# Altium footprint library myLibs.PcbLib: 48 footprints (part 1 of 3)
Each footprint in its own frame and in the unit in brackets; x right, y up, seen from the top. Pads: shape width x height; smd on the part's side, far side on the other; paste and mask are expansions set on the pad; w line width, h text height; cw(c..) or ccw(c..) is an arc to the next point about the centre after c.
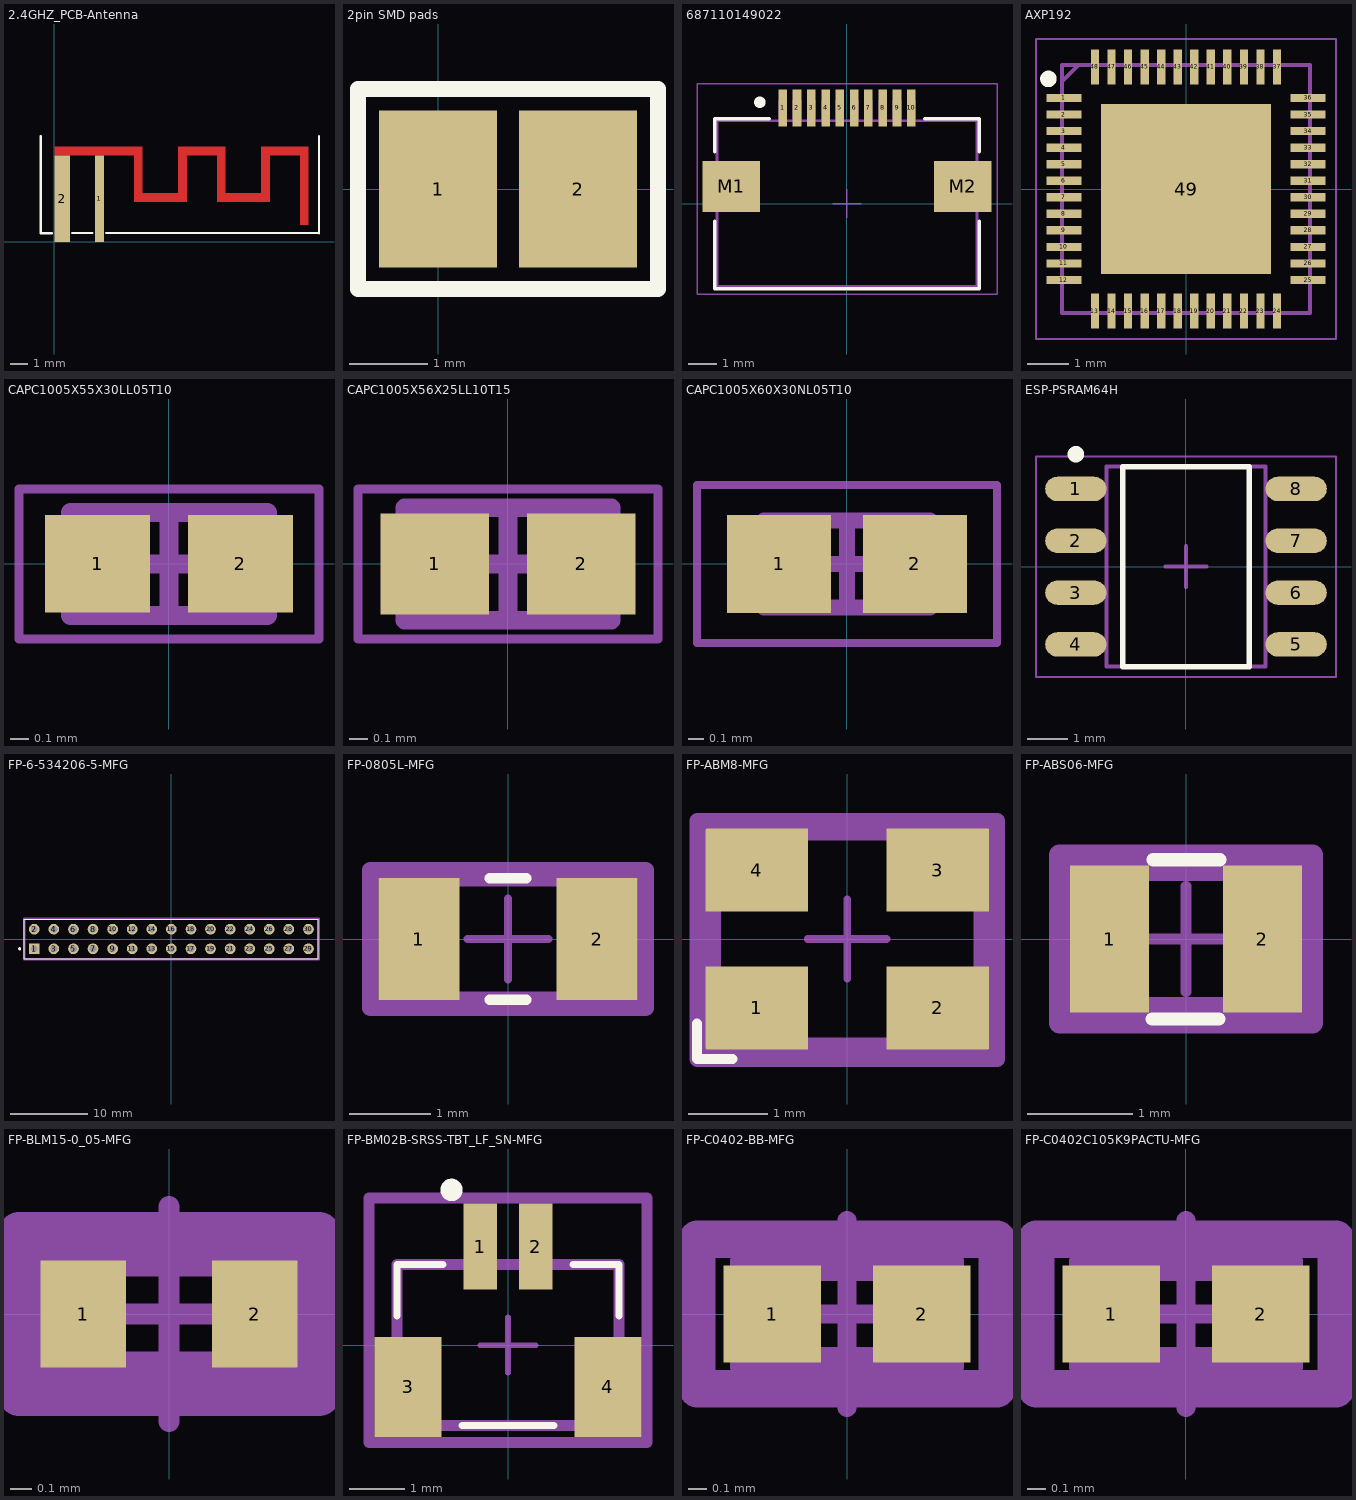
[diagram p0: the footprints below, top view; thin cyan lines are the x and y axes]

## 2.4GHZ_PCB-Antenna [mm] "2.4GHZ_PCB-Antenna"
pads (2):
  rect 0.5x4.9 smd mask+0.102: 1(2.55,2.45)
  rect 0.9x4.9 smd mask+0.102: 2(0.45,2.45)
Top Layer:
  rectangle: 5,2.26 7,2.76
  rectangle: 4.5,2.26 5,4.9
  rectangle: 7,2.26 7.5,4.9
  rectangle: 9.2,2.26 9.7,4.9
  rectangle: 9.7,2.26 11.7,2.76
  rectangle: 11.7,2.26 12.2,4.9
  rectangle: 13.9,0.96 14.4,4.9
  rectangle: 11.7,4.9 14.4,5.4
  rectangle: 7,4.9 9.7,5.4
  rectangle: 0,4.9 5,5.4
Top Overlay:
  lines w0.127: -0.762,6 -0.762,0.5 -0.135,0.5 ; 1.016,0.508 2.159,0.508 ; 2.921,0.508 14.978,0.508 ; 14.986,0.5 14.986,6
Multi-Layer:
  pour cut-out: -0.5,6 -0.5,0.5 14.7,0.5 14.7,6 -0.5,6 -0.5,0.5 14.7,0.5 14.7,6
  pour cut-out: -0.762,6 -0.762,0.5 14.986,0.5 14.986,6

## 2pin SMD pads [mm] "generic pads"
pads (2):
  rect 1.5x2 smd mask+0.102: 1(0,0) 2(1.778,0)
Top Overlay:
  lines w0.2: -1.016,-1.27 2.794,-1.27 2.794,1.27 -1.016,1.27 -1.016,-1.27

## 687110149022 [mm]
pads (12):
  rect 0.3x1.3 smd: 1(-2.25,3.35) 2(-1.75,3.35) 3(-1.25,3.35) 4(-0.75,3.35) 5(-0.25,3.35) 6(0.25,3.35) 7(0.75,3.35) 8(1.25,3.35) 9(1.75,3.35) 10(2.25,3.35)
  rect 2x1.8 smd: M1(-4.05,0.6) M2(4.05,0.6)
Top Overlay:
  circle w0.25: c-3.05,3.55 r0.076
  lines w0.127: -4.625,-0.625 -4.625,-2.975 4.625,-2.975 4.625,-0.625 ; -4.625,1.825 -4.625,2.975 -2.725,2.975 ; 2.725,2.975 4.625,2.975 4.625,1.825
Top Designator:
  text ".Designator" at -7.498,-0.5 h1.5
Top Component Outline:
  lines w0.1: -2.35,2.9 -2.35,3.6 -2.15,3.6 -2.15,2.9 ; -1.85,2.9 -1.85,3.6 -1.65,3.6 -1.65,2.9 ; -1.35,2.9 -1.35,3.6 -1.15,3.6 -1.15,2.9 ; -0.85,2.9 -0.85,3.6 -0.65,3.6 -0.65,2.9 ; -0.35,2.9 -0.35,3.6 -0.15,3.6 -0.15,2.9 ; 0.15,2.9 0.15,3.6 0.35,3.6 0.35,2.9 ; 0.65,2.9 0.65,3.6 0.85,3.6 0.85,2.9 ; 1.15,2.9 1.15,3.6 1.35,3.6 1.35,2.9 ; 1.65,2.9 1.65,3.6 1.85,3.6 1.85,2.9 ; 2.15,2.9 2.15,3.6 2.35,3.6 2.35,2.9 ; -4.55,-2.9 -4.55,2.9 4.55,2.9 4.55,-2.9 -4.55,-2.9
Top 3D Body:
  lines w0.1: -2.35,2.9 -2.35,3.6 -2.15,3.6 -2.15,2.9 ; -1.85,2.9 -1.85,3.6 -1.65,3.6 -1.65,2.9 ; -1.35,2.9 -1.35,3.6 -1.15,3.6 -1.15,2.9 ; -0.85,2.9 -0.85,3.6 -0.65,3.6 -0.65,2.9 ; -0.35,2.9 -0.35,3.6 -0.15,3.6 -0.15,2.9 ; 0.15,2.9 0.15,3.6 0.35,3.6 0.35,2.9 ; 0.65,2.9 0.65,3.6 0.85,3.6 0.85,2.9 ; 1.15,2.9 1.15,3.6 1.35,3.6 1.35,2.9 ; 1.65,2.9 1.65,3.6 1.85,3.6 1.85,2.9 ; 2.15,2.9 2.15,3.6 2.35,3.6 2.35,2.9 ; -4.55,-2.9 4.55,-2.9 4.55,2.9 -4.55,2.9 -4.55,-2.9
Top Courtyard:
  lines w0.05: -0.5,0 0.5,0 ; 0,-0.5 0,0.5 ; -5.25,-3.175 -5.25,4.2 5.25,4.2 5.25,-3.175 -5.25,-3.175
3D body "687110149022.stp": height 2.25, standoff 0, extent -4.55,-2.9 4.55,3.6

## AXP192 [mm]
pads (49):
  rect 0.85x0.2 smd: 1(-2.95,2.2) 2(-2.95,1.8) 3(-2.95,1.4) 4(-2.95,1) 5(-2.95,0.6) 6(-2.95,0.2) 7(-2.95,-0.2) 8(-2.95,-0.6) 9(-2.95,-1) 10(-2.95,-1.4) 11(-2.95,-1.8) 12(-2.95,-2.2) 25(2.95,-2.2) 26(2.95,-1.8) 27(2.95,-1.4) 28(2.95,-1) 29(2.95,-0.6) 30(2.95,-0.2) 31(2.95,0.2) 32(2.95,0.6) 33(2.95,1) 34(2.95,1.4) 35(2.95,1.8) 36(2.95,2.2)
  rect 0.2x0.85 smd: 13(-2.2,-2.95) 14(-1.8,-2.95) 15(-1.4,-2.95) 16(-1,-2.95) 17(-0.6,-2.95) 18(-0.2,-2.95) 19(0.2,-2.95) 20(0.6,-2.95) 21(1,-2.95) 22(1.4,-2.95) 23(1.8,-2.95) 24(2.2,-2.95) 37(2.2,2.95) 38(1.8,2.95) 39(1.4,2.95) 40(1,2.95) 41(0.6,2.95) 42(0.2,2.95) 43(-0.2,2.95) 44(-0.6,2.95) 45(-1,2.95) 46(-1.4,2.95) 47(-1.8,2.95) 48(-2.2,2.95)
  rect 4.1x4.1 smd: 49(0,0)
Top Overlay:
  circle w0.2: c-3.325,2.66 r0.1
Top 3D Body:
  lines w0.1: -3,2.6 -2.6,3 ; -3,-3 -3,3 3,3 3,-3 -3,-3
Top Courtyard:
  lines w0.05: -3.625,-3.625 -3.625,3.625 3.625,3.625 3.625,-3.625 -3.625,-3.625
3D body "AXP192.stp": height 0.92, standoff 0, extent -3.05,-3.05 3.05,3.05

## CAPC1005X55X30LL05T10 [mm]
pads (2):
  rect 0.56x0.52 smd: 1(-0.38,0) 2(0.38,0)
Top 3D Body:
  lines w0.1: -0.525,-0.275 0.525,-0.275 0.525,0.275 -0.525,0.275 -0.525,-0.275
Top Courtyard:
  lines w0.05: -0.8,-0.4 0.8,-0.4 0.8,0.4 -0.8,0.4 -0.8,-0.4
  lines w0.1: -0.275,0 0.275,0 ; 0,-0.275 0,0.275
3D body: height 0.55, standoff 0, extent 0.225,-0.275 0.525,0.275
3D body: height 0.55, standoff 0, extent -0.525,-0.275 -0.225,0.275
3D body: height 0.55, standoff 0, extent -0.225,-0.275 0.225,0.275

## CAPC1005X56X25LL10T15 [mm]
pads (2):
  rect 0.58x0.54 smd: 1(-0.39,0) 2(0.39,0)
Top 3D Body:
  lines w0.1: -0.55,-0.3 -0.55,0.3 0.55,0.3 0.55,-0.3 -0.55,-0.3
Top Courtyard:
  lines w0.05: -0.8,-0.4 -0.8,0.4 0.8,0.4 0.8,-0.4 -0.8,-0.4
  lines w0.1: -0.3,0 0.3,0 ; 0,-0.3 0,0.3
3D body: height 0.56, standoff 0, extent -0.3,-0.3 0.3,0.3
3D body: height 0.56, standoff 0, extent -0.55,-0.3 -0.3,0.3
3D body: height 0.56, standoff 0, extent 0.3,-0.3 0.55,0.3

## CAPC1005X60X30NL05T10 [mm]
pads (2):
  rect 0.66x0.62 smd: 1(-0.43,0) 2(0.43,0)
Top 3D Body:
  lines w0.1: -0.525,-0.275 -0.525,0.275 0.525,0.275 0.525,-0.275 -0.525,-0.275
Top Courtyard:
  lines w0.05: -0.95,-0.5 -0.95,0.5 0.95,0.5 0.95,-0.5 -0.95,-0.5
  lines w0.1: -0.275,0 0.275,0 ; 0,-0.275 0,0.275
3D body: height 0.6, standoff 0, extent -0.225,-0.275 0.225,0.275
3D body: height 0.6, standoff 0, extent -0.525,-0.275 -0.225,0.275
3D body: height 0.6, standoff 0, extent 0.225,-0.275 0.525,0.275

## ESP-PSRAM64H [mm] "64 Mbit serial pseudo SRAM"
height 1.75
pads (8):
  oval 1.5x0.6 smd: 1(-2.7,1.905) 2(-2.7,0.635) 3(-2.7,-0.635) 4(-2.7,-1.905) 5(2.7,-1.905) 6(2.7,-0.635) 7(2.7,0.635) 8(2.7,1.905)
Top Overlay:
  circle w0.25: c-2.7,2.755 r0.076
  lines w0.127: -1.55,-2.45 1.55,-2.45 1.55,2.45 -1.55,2.45 -1.55,-2.45
Top Assembly:
  lines w0.1: -1.95,-2.45 1.95,-2.45 1.95,2.45 -1.95,2.45 -1.95,-2.45
Top Courtyard:
  lines w0.05: -3.675,-2.7 3.675,-2.7 3.675,2.7 -3.675,2.7 -3.675,-2.7
  lines w0.1: -0.5,0 0.5,0 ; 0,-0.5 0,0.5
3D body "SOP127P600X175-8N.step": height 1.75, standoff 0, extent -3,-2.45 3,2.45

## FP-6-534206-5-MFG [mm]
pads (30):
  rect 1.39x1.39 hole 0.89 paste-1000 mask+0: 1(-17.78,-1.27)
  round 1.39 hole 0.89 paste-1000 mask+0: 2(-17.78,1.27) 3(-15.24,-1.27) 4(-15.24,1.27) 5(-12.7,-1.27) 6(-12.7,1.27) 7(-10.16,-1.27) 8(-10.16,1.27) 9(-7.62,-1.27) 10(-7.62,1.27) 11(-5.08,-1.27) 12(-5.08,1.27) 13(-2.54,-1.27) 14(-2.54,1.27) 15(0,-1.27) 16(0,1.27) 17(2.54,-1.27) 18(2.54,1.27) 19(5.08,-1.27) 20(5.08,1.27) 21(7.62,-1.27) 22(7.62,1.27) 23(10.16,-1.27) 24(10.16,1.27) 25(12.7,-1.27) 26(12.7,1.27) 27(15.24,-1.27) 28(15.24,1.27) 29(17.78,-1.27) 30(17.78,1.27)
Top Overlay:
  circle w0.25: c-19.685,-1.27 r0.076
  lines w0.127: -19.05,-2.58 19.05,-2.58 19.05,2.58 -19.05,2.58 -19.05,-2.58
Top Assembly:
  lines w0.2: -19.15,-2.68 19.15,-2.68 19.15,2.68 -19.15,2.68 -19.15,-2.68
  text ".Designator" at 0,-0.001 h1
Top 3D Body:
  lines w0.2: -19.05,-2.58 19.05,-2.58 19.05,2.58 -19.05,2.58 -19.05,-2.58
Top Courtyard:
  lines w0.2: -19.15,-2.68 19.15,-2.68 19.15,2.68 -19.15,2.68 -19.15,-2.68
Top Component Center:
  lines w0.1: -0.5,0 0.5,0 ; 0,-0.5 0,0.5
3D body "Conn_TE_6-534206-5_eec.STEP": height 0.25, standoff 0, extent -19.15,-2.68 19.15,2.68

## FP-0805L-MFG [mm]
pads (2):
  rect 1x1.5 smd paste+0 mask+0: 1(-1.1,0) 2(1.1,0)
Top Overlay:
  lines w0.127: -0.225,-0.75 0.225,-0.75 ; -0.225,0.75 0.225,0.75
Top Assembly:
  lines w0.2: -1.7,-0.85 -1.7,0.85 1.7,0.85 1.7,-0.85 -1.7,-0.85
  text ".Designator" at 0,0 h1
Top 3D Body:
  lines w0.2: -1.1,-0.75 1.1,-0.75 1.1,0.75 -1.1,0.75 -1.1,-0.75
Top Courtyard:
  lines w0.2: -1.7,-0.85 -1.7,0.85 1.7,0.85 1.7,-0.85 -1.7,-0.85
Top Component Center:
  lines w0.1: -0.5,0 0.5,0 ; 0,-0.5 0,0.5
3D body "Fuse_Littelfuse_Inc_0805L050WR_eec.STEP": height 0.25, standoff 0, extent -1.7,-0.85 1.7,0.85

## FP-ABM8-MFG [mm]
pads (4):
  rect 1.3x1.05 smd paste+0 mask+0: 1(-1.15,-0.875) 2(1.15,-0.875) 3(1.15,0.875) 4(-1.15,0.875)
Top Overlay:
  lines w0.127: -1.905,-1.074 -1.905,-1.524 -1.455,-1.524
Top Assembly:
  lines w0.2: -1.9,-1.5 -1.9,1.5 1.9,1.5 1.9,-1.5 -1.9,-1.5
  text ".Designator" at 0,0.188 h1
Top 3D Body:
  lines w0.2: -1.7,-1.35 -1.7,1.35 1.7,1.35 1.7,-1.35 -1.7,-1.35
Top Courtyard:
  lines w0.2: -1.9,-1.524 -1.9,1.5 1.9,1.5 1.9,-1.524 -1.9,-1.524
Top Component Center:
  lines w0.1: -0.5,0 0.5,0 ; 0,-0.5 0,0.5
3D body "Crys_Abracon_ABM8-24_000MHZ-B2-T_eec.STEP": height 0.25, standoff 0, extent -1.9,-1.5 1.9,1.5

## FP-ABS06-MFG [mm]
pads (2):
  rect 0.75x1.4 smd paste+0 mask+0: 1(-0.725,0) 2(0.725,0)
Top Overlay:
  lines w0.127: -0.323,-0.76 0.312,-0.76 ; -0.313,0.753 0.322,0.753
Top Assembly:
  lines w0.2: -1.2,-0.8 -1.2,0.8 1.2,0.8 1.2,-0.8 -1.2,-0.8
  text ".Designator" at 0,0.188 h1
Top 3D Body:
  lines w0.2: -1.075,-0.65 -1.075,0.65 1.075,0.65 1.075,-0.65 -1.075,-0.65
Top Courtyard:
  lines w0.2: -1.2,-0.8 1.2,-0.8 1.2,0.8 -1.2,0.8 -1.2,-0.8
Top Component Center:
  lines w0.1: -0.5,0 0.5,0 ; 0,-0.5 0,0.5
3D body "Crys_Abracon_ABS06-32_768KHZ-1-T_eec.STEP": height 0.25, standoff 0, extent -1.2,-0.8 1.2,0.8

## FP-BLM15-0_05-MFG [mm]
pads (2):
  rect 0.4x0.5 smd paste+0 mask+0: 1(-0.4,0) 2(0.4,0)
Top Assembly:
  lines w0.2: -0.7,-0.375 0.7,-0.375 0.7,0.375 -0.7,0.375 -0.7,-0.375
  text ".Designator" at 0,0.188 h1
Top 3D Body:
  lines w0.2: -0.525,-0.275 0.525,-0.275 0.525,0.275 -0.525,0.275 -0.525,-0.275
Top Courtyard:
  lines w0.2: -0.7,-0.375 0.7,-0.375 0.7,0.375 -0.7,0.375 -0.7,-0.375
Top Component Center:
  lines w0.1: -0.5,0 0.5,0 ; 0,-0.5 0,0.5
3D body "FBead_Murata_BLM15PX471SN1B_eec.STEP": height 0.25, standoff 0, extent -0.7,-0.375 0.7,0.375

## FP-BM02B-SRSS-TBT_LF_SN-MFG [mm]
pads (4):
  rect 0.6x1.55 smd paste+0 mask+0: 1(-0.5,1.775) 2(0.5,1.775)
  rect 1.2x1.8 smd paste+0 mask+0: 3(-1.8,-0.75) 4(1.8,-0.75)
Top Overlay:
  circle w0.25: c-1.016,2.794 r0.076
  lines w0.127: -2,0.525 -2,1.45 -1.175,1.45 ; -0.825,-1.45 0.825,-1.45 ; 1.175,1.45 2,1.45 2,0.525
Top Assembly:
  lines w0.2: -2.5,-1.75 2.5,-1.75 2.5,2.65 -2.5,2.65 -2.5,-1.75
  text ".Designator" at 0,0.638 h1
Top 3D Body:
  lines w0.2: -2,-1.45 2,-1.45 2,1.45 -2,1.45 -2,-1.45
Top Courtyard:
  lines w0.2: -2.5,-1.75 2.5,-1.75 2.5,2.65 -2.5,2.65 -2.5,-1.75
Top Component Center:
  lines w0.1: -0.5,0 0.5,0 ; 0,-0.5 0,0.5
3D body "Conn_JST_BM02B-SRSS-TBT_LF_SN_eec.STEP": height 0.25, standoff 0, extent -2.5,-1.75 2.5,2.65

## FP-C0402-BB-MFG [mm]
pads (2):
  rect 0.52x0.52 smd paste+0 mask+0: 1(-0.4,0) 2(0.4,0)
Top Assembly:
  lines w0.2: -0.8,-0.4 -0.8,0.4 0.8,0.4 0.8,-0.4 -0.8,-0.4
  text ".Designator" at 0,0.188 h1
Top 3D Body:
  lines w0.2: -0.525,-0.275 -0.525,0.275 0.525,0.275 0.525,-0.275 -0.525,-0.275
Top Courtyard:
  lines w0.2: -0.8,-0.4 -0.8,0.4 0.8,0.4 0.8,-0.4 -0.8,-0.4
Top Component Center:
  lines w0.1: -0.5,0 0.5,0 ; 0,-0.5 0,0.5
3D body "Cap_Kemet_C0402C562J5RACTU_eec.STEP": height 0.25, standoff 0, extent -0.8,-0.4 0.8,0.4

## FP-C0402C105K9PACTU-MFG [mm]
pads (2):
  rect 0.52x0.52 smd paste+0 mask+0: 1(-0.4,0) 2(0.4,0)
Top Assembly:
  lines w0.2: -0.8,-0.4 0.8,-0.4 0.8,0.4 -0.8,0.4 -0.8,-0.4
  text ".Designator" at 0,0.188 h1
Top 3D Body:
  lines w0.2: -0.525,-0.275 0.525,-0.275 0.525,0.275 -0.525,0.275 -0.525,-0.275
Top Courtyard:
  lines w0.2: -0.8,-0.4 0.8,-0.4 0.8,0.4 -0.8,0.4 -0.8,-0.4
Top Component Center:
  lines w0.1: -0.5,0 0.5,0 ; 0,-0.5 0,0.5
3D body "Cap_Murata_GRM155C81E105KE11D_eec.STEP": height 0.25, standoff 0, extent -0.886,-0.436 0.886,0.436